# Altium footprint library ParsaLibrary.PcbLib: 526 footprints (part 3 of 33)
Each footprint in its own frame and in the unit in brackets; x right, y up, seen from the top. Pads: shape width x height; smd on the part's side, far side on the other; paste and mask are expansions set on the pad; w line width, h text height; cw(c..) or ccw(c..) is an arc to the next point about the centre after c.
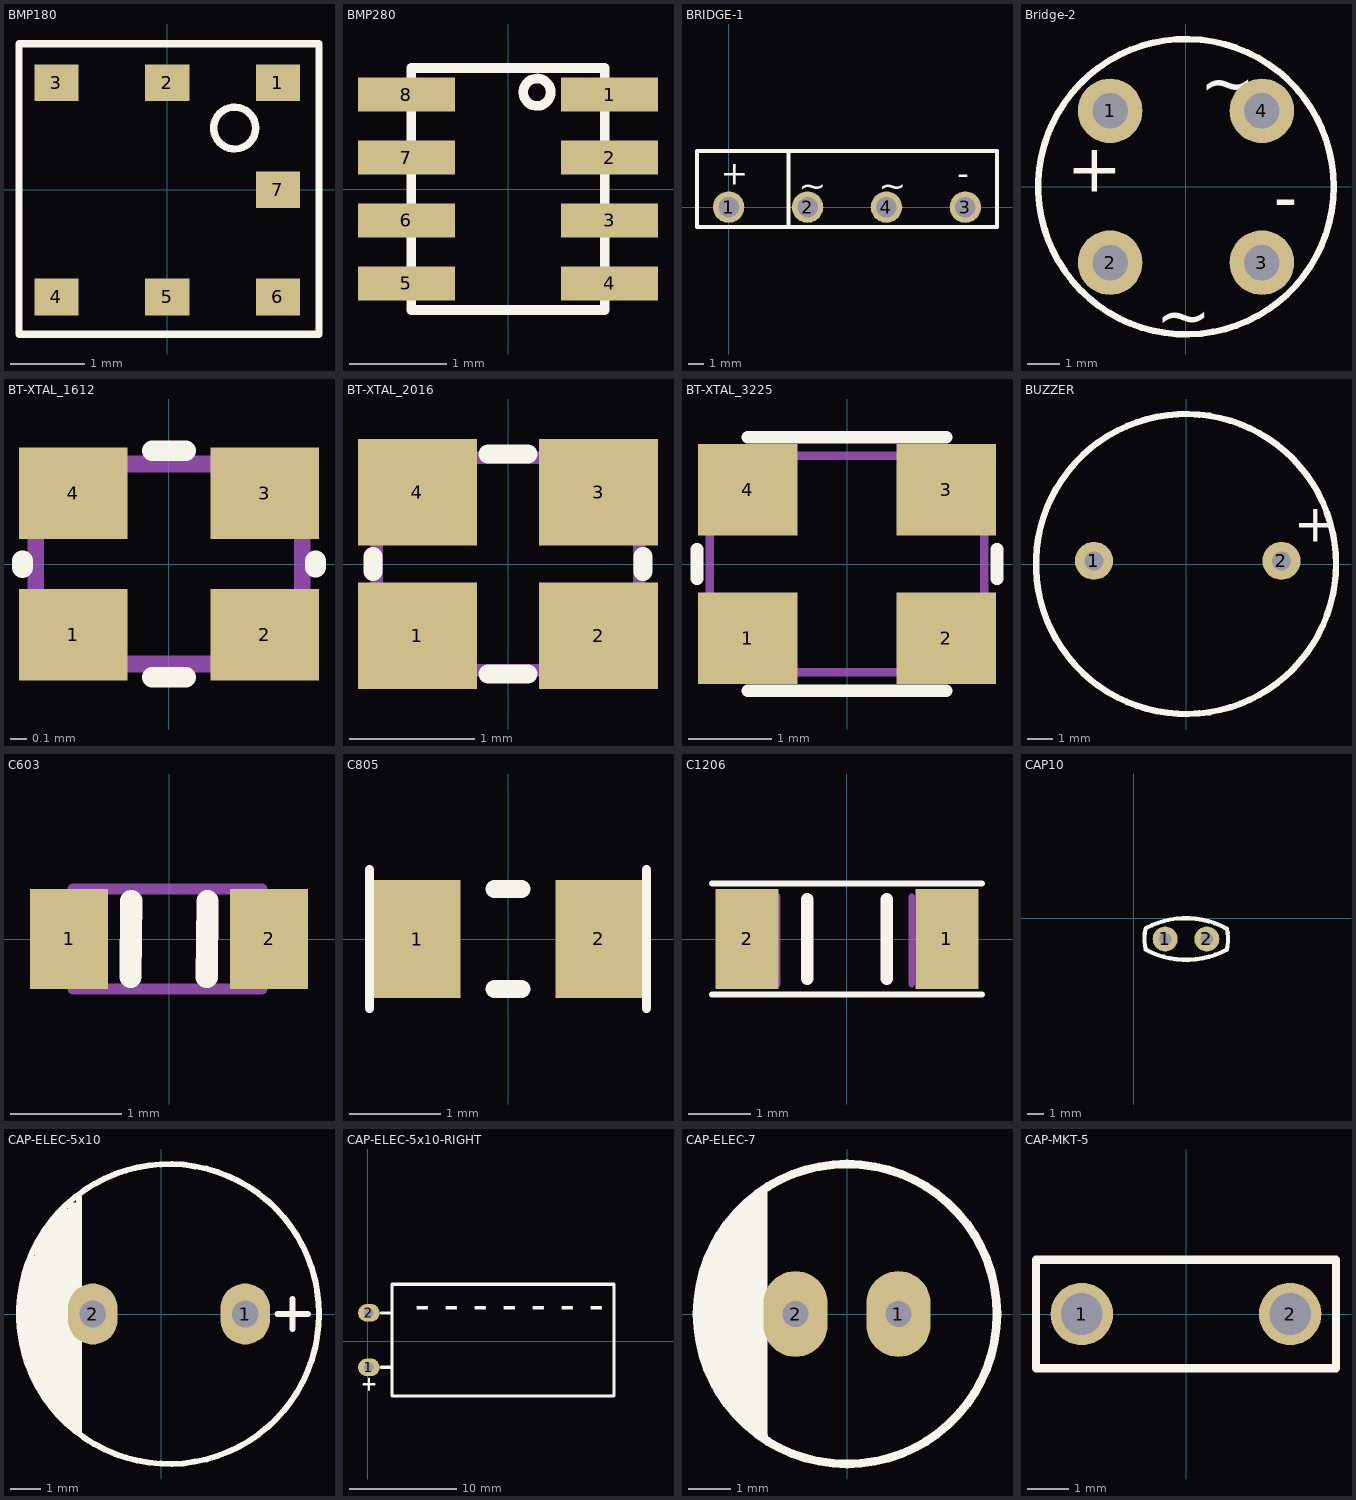
[diagram p2: the footprints below, top view; thin cyan lines are the x and y axes]

## BMP180 [mm]
height 2
pads (7):
  rect 0.6x0.5 smd: 1(1.5,1.45) 2(0,1.45) 3(-1.5,1.45) 4(-1.5,-1.45) 5(0,-1.45) 6(1.5,-1.45) 7(1.5,0)
Top Overlay:
  circle w0.1: c0.913,0.836 r0.284
  lines w0.1: -2.008,-1.958 2.056,-1.958 2.056,1.979 -2.008,1.979 -2.008,-1.958
3D body "BMP180.STEP": height 0.98, standoff 0, extent -1.875,-1.778 1.925,1.822

## BMP280 [mm]
pads (8):
  rect 1x0.35 smd: 1(1.05,0.975) 2(1.05,0.325) 3(1.05,-0.325) 4(1.05,-0.975) 5(-1.05,-0.975) 6(-1.05,-0.325) 7(-1.05,0.325) 8(-1.05,0.975)
Top Overlay:
  circle w0.1: c0.3,1 r0.141
  lines w0.1: -1,-1.25 -1,1.25 1,1.25 1,-1.25 -1,-1.25
3D body "User Library-BST-BMP280.step": height 1, standoff 0, extent -1,-1.25 1,1.25

## BRIDGE-1 [mm] "DIODE BRIDGE"
height 15
pads (4):
  round 2 hole 1.3: 1(0,0) 2(5,0) 3(15,0) 4(10,0)
Top Overlay:
  lines w0.254: 3.81,-1.27 3.81,3.556 ; -2,-1.27 -2,3.556 17,3.556 17,-1.27 -2,-1.27
  text "-" at 14.478,1.397 h1.52
  text "~" at 9.525,0.635 h1.52
  text "~" at 4.445,0.635 h1.52
  text "+" at -0.508,1.397 h1.52

## Bridge-2 [mm]
height 5.1
pads (4):
  round 2 hole 1.1: 1(-2.35,2.35) 2(-2.35,-2.35) 3(2.35,-2.35) 4(2.35,2.35)
Top Overlay:
  circle w0.2: c0,0 r4.572
  text "~" at 0.432,2.489 h1.5
  text "~" at -0.942,-4.714 h1.5
  text "+" at -3.698,-0.152 h1.5
  text "-" at 2.723,-1.054 h1.5
3D body "bridge.STEP": height 5.21, standoff -1.9, extent -3.923,-4.064 4.177,4.036

## BT-XTAL_1612 [mm]
pads (4):
  rect 0.65x0.55 smd: 1(-0.575,-0.425) 2(0.575,-0.425) 3(0.575,0.425) 4(-0.575,0.425)
Top Overlay:
  lines w0.125: -0.88,-0.02 -0.88,0.02 ; -0.1,-0.68 0.1,-0.68 ; -0.1,0.68 0.1,0.68 ; 0.88,-0.02 0.88,0.02
Mechanical 7:
  lines w0.1: -0.8,-0.6 -0.8,0.6 0.8,0.6 0.8,-0.6 -0.8,-0.6
  text ".Designator" at -0.6,-0.15 h0.38
3D body: height 0.41, standoff 0.15, extent -0.7,-0.513 0.7,0.513
3D body "User Library-Siward_AX1612.step": height 0.41, standoff 0, extent -0.83,-0.629 0.83,0.629

## BT-XTAL_2016 [mm]
pads (4):
  rect 0.95x0.85 smd: 1(-0.725,-0.575) 2(0.725,-0.575) 3(0.725,0.575) 4(-0.725,0.575)
Top Overlay:
  lines w0.152: -1.08,-0.06 -1.08,0.06 ; -0.16,-0.88 0.16,-0.88 ; -0.16,0.88 0.16,0.88 ; 1.08,-0.06 1.08,0.06
Mechanical 7:
  lines w0.1: -1.05,-0.85 1.05,-0.85 1.05,0.85 -1.05,0.85 -1.05,-0.85
  text ".Designator" at 0.248,0.177 h0.3
3D body: height 0.56, standoff 0.15, extent -0.7,-0.65 0.7,0.65
3D body "User Library-GeyerElectronics_KX5.step": height 0.56, standoff 0, extent -1.05,-0.85 1.05,0.85

## BT-XTAL_3225 [mm]
pads (4):
  rect 1.2x1.1 smd: 1(-1.194,-0.89) 2(1.194,-0.89) 3(1.194,0.891) 4(-1.194,0.891)
Top Overlay:
  lines w0.152: -1.803,-0.178 -1.803,0.178 ; -1.194,-1.524 1.194,-1.524 ; -1.194,1.524 1.194,1.524 ; 1.803,-0.178 1.803,0.178
Mechanical 7:
  lines w0.1: -1.65,-1.3 1.65,-1.3 1.65,1.3 -1.65,1.3 -1.65,-1.3
  text ".Designator" at -0.845,-0.133 h0.38
3D body "User Library-tsx-3225.STEP": height 0.6, standoff 0, extent -1.6,-1.25 1.6,1.25

## BUZZER [mil]
pads (2):
  round 60 hole 30: 1(-145,5) 2(150.28,5)
Top Overlay:
  circle w10: c0,0 r236.22
  text "+" at 170,35 h60
3D body "buzzer.stp": height 374.02, standoff -216.54, extent -236.21,-231.22 236.23,241.22

## C603 [mm]
pads (2):
  rect 0.7x0.9 smd: 1(-0.9,0) 2(0.9,0)
Top Overlay:
  lines w0.2: -0.347,-0.34 -0.341,0.343 ; 0.341,-0.343 0.347,0.34
Mechanical 13:
  lines w0.1: -0.863,-0.45 -0.863,0.45 0.837,0.45 0.837,-0.45 -0.863,-0.45
3D body "cap 0603.STEP": height 0.6, standoff 0, extent -0.762,-0.381 0.762,0.381

## C805 [mm]
pads (2):
  rect 0.95x1.3 smd: 1(-1,0) 2(1,0)
Top Overlay:
  lines w0.1: -1.524,-0.762 -1.524,0.762 ; 1.524,-0.762 1.524,0.762
  lines w0.2: -0.15,-0.55 0.15,-0.55 ; -0.15,0.55 0.15,0.55
3D body "User Library-0805 SMD Resistor (2).SLDPRT": height 0.78, standoff 0, extent -1,-0.625 1,0.625

## C1206 [mm]
pads (2):
  rect 1x1.6 smd: 1(1.6,0) 2(-1.6,0)
Top Overlay:
  lines w0.1: -2.159,-0.889 2.159,-0.889 ; -2.159,0.889 2.159,0.889
  lines w0.2: -0.635,-0.635 -0.635,0.635 ; 0.635,-0.635 0.635,0.635
Mechanical 13:
  lines w0.1: -1.113,-0.726 -1.113,0.674 ; 1.037,-0.726 1.037,0.674
3D body "User Library-1206 SMD Capacitor.step": height 1, standoff 0, extent -1.6,-0.8 1.6,0.8

## CAP10 [mil]
pads (2):
  round 60 hole 30: 1(75,-50) 2(175,-50)
Top Overlay:
  lines w10: 27.99,-25.75 ccw(c125,-50) 28.29,-75.45 ccw(c125.6,105.1) 223.41,-75.18 ; 29.18,-23.44 cw(c124.4,-205.1) 221.71,-24.55 ; 222.79,-75.73 ccw(c125,-50) 223.1,-25.48
3D body "Cap 100n.STEP": height 272.48, standoff -39.37, extent 11,-83.39 240.87,-16.6

## CAP-ELEC-5x10 [mil]
pads (2):
  oval 65x80 hole 35: 1(110,0) 2(-90,0)
Top Overlay:
  circle w7.87: c10,0 r196.85
  rectangle: -167.83,-74.62 -107.98,71.44
  lines w7.87: -180.91,-47 -180.91,46 ; -173.91,-63 -173.91,62 ; -167.83,-74.62 -167.83,71.44 ; -167.83,73.02 -107.98,73.02 ; -165.07,-77.77 -107.98,-77.77 ; -164.68,80.5 -107.98,80.5 ; -163.89,-84.86 -107.98,-84.86 ; -161.53,87.19 -107.98,87.19 ; -160.35,-91.94 -107.98,-91.94 ; -157.98,93.88 -107.98,93.88 ; -156.8,-98.64 -107.98,-98.64 ; -154.05,100.57 -107.98,100.57 ; -153.26,-105.33 -107.98,-105.72 ; -149.72,107.66 -107.98,107.66 ; -148.14,-112.42 -107.98,-112.42 ; -145.39,114.35 -107.98,114.35 ; -142.63,-119.9 -107.98,-119.9 ; -140.27,121.05 -107.98,121.05 ; -137.12,-127.38 -107.98,-127.38 ; -134.76,127.35 -134.36,127.74 -107.98,127.74 ; -130.82,-134.46 -107.98,-134.46 ; -128.46,134.43 -128.06,134.83 -107.98,134.83 ; -124.13,-141.16 -107.98,-141.16 ; -120.98,142.31 -107.98,142.31 ; -117.83,-146.67 -107.98,-146.67 ; -107.98,-155.72 -107.98,153.72 ; 152.13,0 192.13,0 ; 172.13,-20 172.13,20
3D body "SW3dPS-Cap electro 10x12.5x5.0mm.STEP": height 512.81, standoff -136.91, extent -187.7,-197 208,198.7

## CAP-ELEC-5x10-RIGHT [mil]
pads (2):
  oval 80x65 hole 35: 1(5,-95) 2(5,105)
Top Overlay:
  lines w7.87: -15,-157.13 25,-157.13 ; 5,-177.13 5,-137.13
  lines w11.81: 50,-95 85,-95 ; 50,105 85,105 ; 90,-200 90,210 905,210 905,-200 90,-200
  text "- - - - - - -" at 870,205 h196.85
3D body "User Library-eca-2em220.step": height 401.57, standoff -118.11, extent -6.7,-200 906.69,209.49

## CAP-ELEC-7 [mm]
pads (2):
  oval 1.5x2 hole 0.6: 1(1.2,0) 2(-1.2,0)
Top Overlay:
  circle w0.2: c0,0 r3.5
  lines w0.2: -3.34,-1.02 -3.34,0.96 ; -3.17,-1.45 -3.17,1.47 ; -3,1.8 -3,-1.79 -2.99,-1.8
  lines w0.254: -2.81,-2.01 -2.81,2.03 ; -2.59,-2.29 -2.59,2.3 -2.58,2.31 ; -2.37,-2.51 -2.37,2.52 -2.36,2.53 ; -2.2,-2.67 -2.2,2.59 ; -1.98,2.84 -1.98,-2.84 -1.97,-2.85 ; -2.81,2.03 -2.81,2.03

## CAP-MKT-5 [mm]
pads (2):
  round 1.5 hole 1: 1(-2.5,0) 2(2.5,0)
Top Overlay:
  lines w0.2: -3.6,-1.3 -3.6,1.3 3.6,1.3 3.6,-1.3 -3.6,-1.3
3D body "User Library-B32529-2_5X6_5X7_2.STEP": height 6.5, standoff -3, extent -3.6,-1.25 3.6,1.25